# Altium footprint library zynq.PcbLib: 111 footprints (part 3 of 7)
Each footprint in its own frame and in the unit in brackets; x right, y up, seen from the top. Pads: shape width x height; smd on the part's side, far side on the other; paste and mask are expansions set on the pad; w line width, h text height; cw(c..) or ccw(c..) is an arc to the next point about the centre after c.
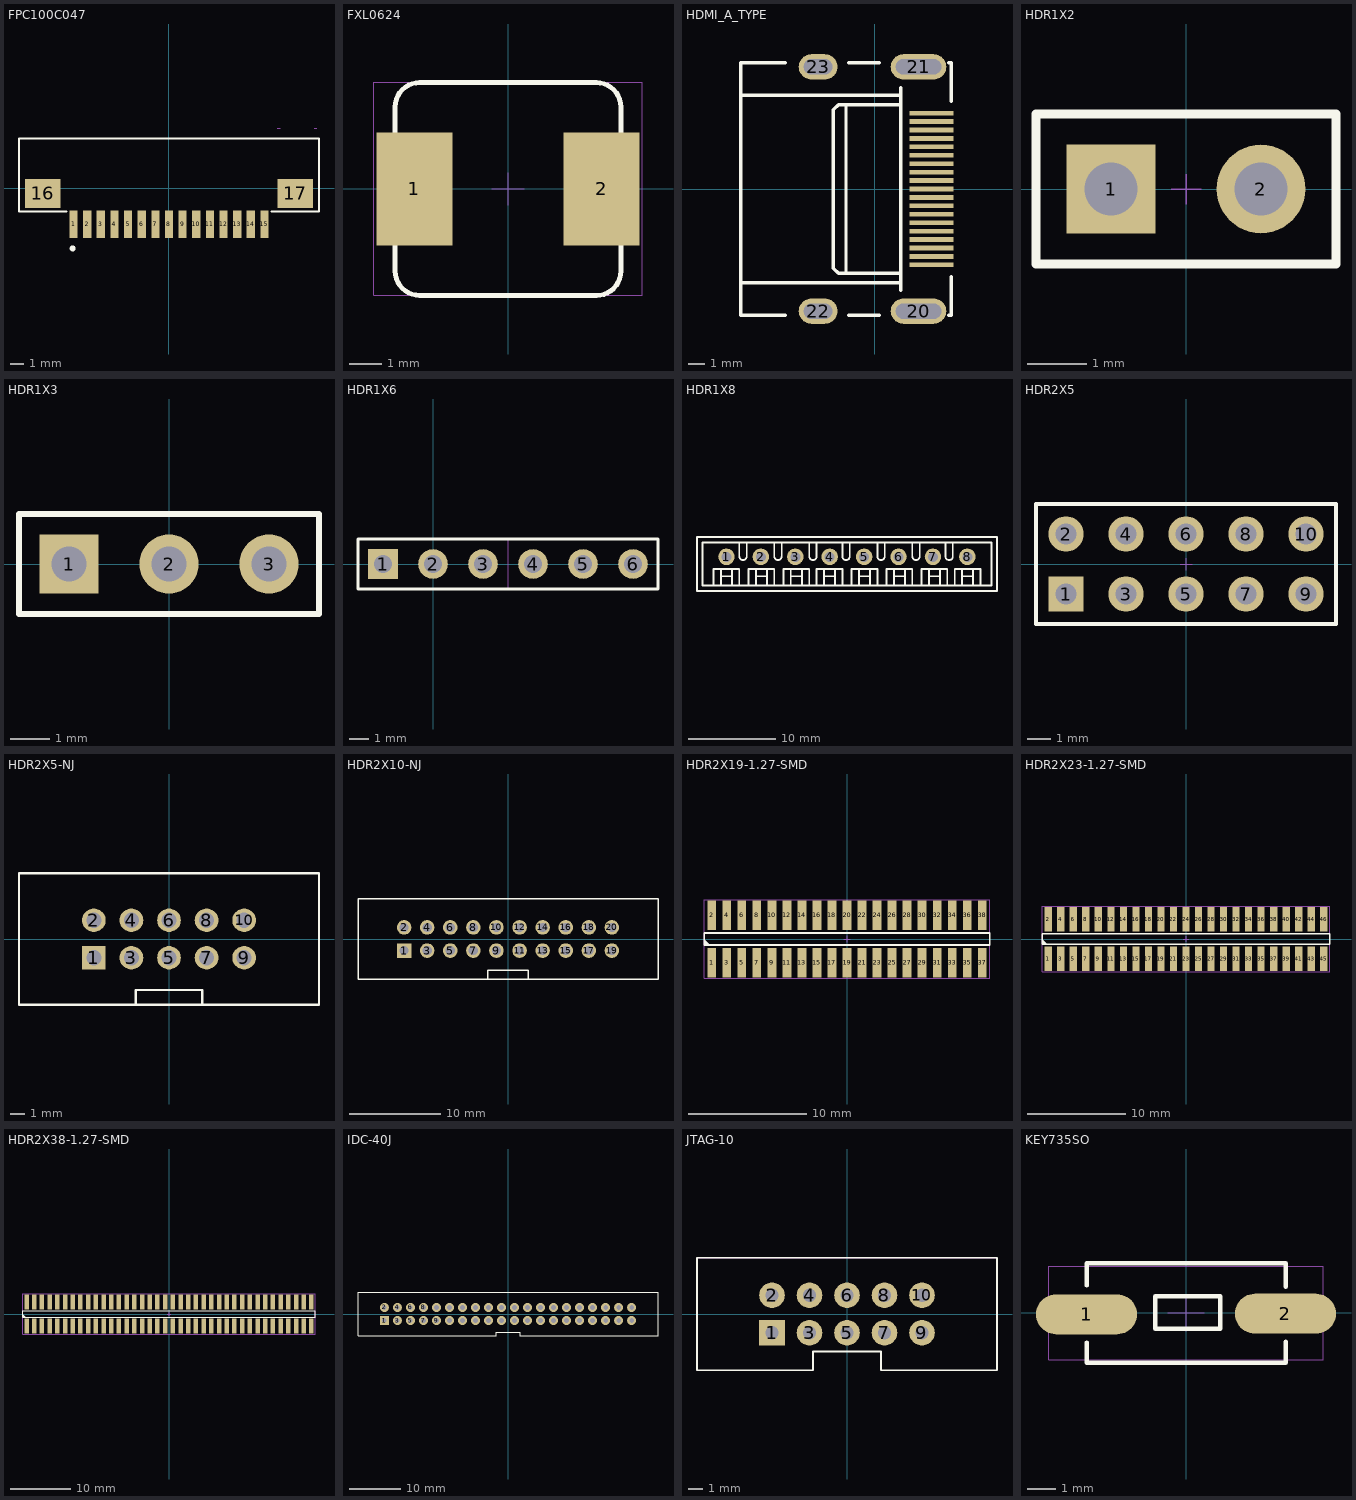
[diagram p2: the footprints below, top view; thin cyan lines are the x and y axes]

## FPC100C047 [mm] "FPC100C047"
pads (17):
  rect 0.6x2 smd: 1(-7,-2.64) 2(-6,-2.64) 3(-5,-2.64) 4(-4,-2.64) 5(-3,-2.64) 6(-2,-2.64) 7(-1,-2.64) 8(0,-2.64) 9(1,-2.64) 10(2,-2.64) 11(3,-2.64) 12(4,-2.64) 13(5,-2.64) 14(6,-2.64) 15(7,-2.64)
  rect 2.6x2.1 smd: 16(-9.25,-0.39) 17(9.25,-0.39)
Top Overlay:
  circle w0.254: c-7.061,-4.42 r0.092
  lines w0.152: -7.517,-1.71 -11,-1.71 -11,3.64 11,3.64 11,-1.71 7.517,-1.71
Mechanical 11:
  lines w0.025: 7.952,4.391 8.155,4.391 ; 10.644,4.391 10.847,4.391

## FXL0624 [mm]
pads (2):
  rect 2.35x3.5 smd: 1(-2.9,0) 2(2.9,0)
Top Overlay:
  lines w0.152: 2.738,-3.304 ccw(c2.738,-2.542) 3.5,-2.542 3.5,2.538 ccw(c2.738,2.538) 2.738,3.3 -2.738,3.3 ccw(c-2.738,2.538) -3.5,2.538 -3.5,-2.538 ccw(c-2.738,-2.538) -2.738,-3.3 2.742,-3.3
Mechanical 15:
  lines w0.025: -0.5,0 0.5,0 ; 0,-0.5 0,0.5 ; -4.166,-3.302 -4.166,3.302 4.166,3.302 4.166,-3.302 -4.166,-3.302
3D body "FXL0630.STEP": height 2.35, standoff 0, extent -3.74,-3.302 3.74,3.298

## HDMI_A_TYPE [mm] "HDMI_A_TYPE"
pads (23):
  rect 2.6x0.28 smd: 1(3.361,-4.5) 2(3.361,-4) 3(3.361,-3.5) 4(3.361,-3) 5(3.361,-2.5) 6(3.361,-2) 7(3.361,-1.5) 8(3.361,-1) 9(3.361,-0.5) 10(3.361,0) 11(3.361,0.5) 12(3.361,1) 13(3.361,1.5) 14(3.361,2) 15(3.361,2.5) 16(3.361,3) 17(3.361,3.5) 18(3.361,4) 19(3.361,4.5)
  oval 3.3x1.5 hole 2.7 slot 0.9 at 90 deg: 20(2.6,-7.25) 21(2.6,7.25)
  oval 2.3x1.5 hole 1.7 slot 0.9 at 90 deg: 22(-3.361,-7.25) 23(-3.361,7.25)
Top Overlay:
  lines w0.203: -7.951,-5.551 1.549,-5.551 ; -7.951,5.551 1.549,5.551 ; -5.297,-7.5 -7.951,-7.5 -7.951,7.5 -5.297,7.5 ; -1.706,-5 -1.706,5 ; -1.552,-7.5 0.266,-7.5 ; -1.552,7.5 0.266,7.5 ; 1.549,-6 1.549,6 ; 1.549,-5 -2.151,-5 -2.451,-4.7 -2.451,4.7 -2.151,5 1.549,5 ; 4.383,-7.5 4.549,-7.5 4.549,-5.214 ; 4.383,7.5 4.549,7.5 4.549,5.214

## HDR1X2 [mm] "Connector; Header; 5x2 Position"
pads (2):
  rect 1.5x1.5 hole 0.9: 1(-1.27,0)
  round 1.5 hole 0.9: 2(1.27,0)
Top Overlay:
  lines w0.152: -2.54,-1.27 -2.54,1.27 2.54,1.27 2.54,-1.27 -2.54,-1.27
Mechanical 15:
  lines w0.025: -0.254,0 0.254,0 ; 0,-0.254 0,0.254 ; -2.54,-1.27 -2.54,1.27 2.54,1.27 2.54,-1.27 -2.54,-1.27
3D body "header-2.54-1x2.STEP": height 9.3, standoff -2.2, extent -2.54,-1.25 2.54,1.25

## HDR1X3 [mm] "Connector; Header; 5x2 Position"
pads (3):
  rect 1.5x1.5 hole 0.9: 1(-2.54,0)
  round 1.5 hole 0.9: 2(0,0) 3(2.54,0)
Top Overlay:
  lines w0.152: -3.81,-1.27 -3.81,1.27 3.81,1.27 3.81,-1.27 -3.81,-1.27
Mechanical 15:
  lines w0.025: -0.254,0 0.254,0 ; 0,-0.254 0,0.254 ; -3.81,-1.27 3.81,-1.27 3.81,1.27 -3.81,1.27 -3.81,-1.27
3D body "header-2.54-1x3.STEP": height 9.3, standoff -2.2, extent -3.81,-1.25 3.81,1.25

## HDR1X6 [mm] "Connector; Header; 5x2 Position"
pads (6):
  rect 1.5x1.5 hole 0.9: 1(-2.54,0)
  round 1.5 hole 0.9: 2(0,0) 3(2.54,0) 4(5.08,0) 5(7.62,0) 6(10.16,0)
Top Overlay:
  lines w0.152: -3.81,-1.27 11.43,-1.27 11.43,1.27 -3.81,1.27 -3.81,-1.27
Mechanical 15:
  lines w0.025: -0.254,0 0.254,0 ; 0,-0.254 0,0.254 ; -3.81,-1.27 -3.81,1.27 3.81,1.27 3.81,-1.27 -3.81,-1.27

## HDR1X8 [mm]
pads (8):
  round 1.9 hole 1.15: 1(6.401,-44.145) 2(10.359,-44.145) 3(14.317,-44.145) 4(18.275,-44.145) 5(22.233,-44.145) 6(26.192,-44.145) 7(30.15,-44.145) 8(34.108,-44.145)
Top Overlay:
  lines w0.203: 3.649,-42.494 3.649,-47.447 36.881,-47.447 36.881,-42.494 3.683,-42.494 ; 4.919,-47.447 4.919,-45.542 7.882,-45.542 7.882,-47.447 ; 5.766,-47.447 5.766,-45.542 ; 5.766,-46.389 7.036,-46.389 ; 7.036,-47.447 7.036,-45.542 ; 7.882,-42.621 7.882,-44.103 ccw(c8.306,-44.103) 8.729,-44.103 8.729,-42.621 ; 8.941,-47.447 8.941,-45.542 11.904,-45.542 11.904,-47.447 ; 9.787,-47.447 9.787,-45.542 ; 9.787,-46.389 11.057,-46.389 ; 11.057,-47.447 11.057,-45.542 ; 11.904,-42.621 11.904,-44.103 ccw(c12.327,-44.103) 12.751,-44.103 12.751,-42.621 ; 12.962,-47.447 12.962,-45.542 15.926,-45.542 15.926,-47.447 ; 13.809,-47.447 13.809,-45.542 ; 13.809,-46.389 15.079,-46.389 ; 15.079,-47.447 15.079,-45.542 ; 15.926,-42.621 15.926,-44.103 ccw(c16.349,-44.103) 16.772,-44.103 16.772,-42.621 ; 16.772,-47.447 16.772,-45.542 19.736,-45.542 19.736,-47.447 ; 17.619,-47.447 17.619,-45.542 ; 17.619,-46.389 18.889,-46.389 ; 18.889,-47.447 18.889,-45.542 ; 19.736,-42.621 19.736,-44.103 ccw(c20.159,-44.103) 20.582,-44.103 20.582,-42.621 ; 20.794,-47.447 20.794,-45.542 23.757,-45.542 23.757,-47.447 ; 21.641,-47.447 21.641,-45.542 ; 21.641,-46.389 22.911,-46.389 ; 22.911,-47.447 22.911,-45.542 ; 23.757,-42.621 23.757,-44.103 ccw(c24.181,-44.103) 24.604,-44.103 24.604,-42.621 ; 24.816,-47.447 24.816,-45.542 27.779,-45.542 27.779,-47.447 ; 25.662,-47.447 25.662,-45.542 ; 25.662,-46.389 26.932,-46.389 ; 26.932,-47.447 26.932,-45.542 ; 27.779,-42.621 27.779,-44.103 ccw(c28.202,-44.103) 28.626,-44.103 28.626,-42.621 ; 28.837,-47.447 28.837,-45.542 31.801,-45.542 31.801,-47.447 ; 29.684,-47.447 29.684,-45.542 ; 29.684,-46.389 30.954,-46.389 ; 30.954,-47.447 30.954,-45.542 ; 31.589,-42.621 31.589,-44.103 ccw(c32.012,-44.103) 32.436,-44.103 32.436,-42.621 ; 32.647,-47.447 32.647,-45.542 35.611,-45.542 35.611,-47.447 ; 33.494,-47.447 33.494,-45.542 ; 33.494,-46.389 34.764,-46.389 ; 34.764,-47.447 34.764,-45.542 ; 3.014,-48.082 3.014,-41.859 37.516,-41.859 37.516,-48.082 3.014,-48.082

## HDR2X5 [mm] "Connector; Header; 5x2 Position"
pads (10):
  rect 1.5x1.5 hole 0.9: 1(-5.08,-1.27)
  round 1.5 hole 0.9: 2(-5.08,1.27) 3(-2.54,-1.27) 4(-2.54,1.27) 5(0,-1.27) 6(0,1.27) 7(2.54,-1.27) 8(2.54,1.27) 9(5.08,-1.27) 10(5.08,1.27)
Top Overlay:
  lines w0.152: -6.35,-2.54 6.35,-2.54 6.35,2.54 -6.35,2.54 -6.35,-2.54
Mechanical 15:
  lines w0.025: -0.254,0 0.254,0 ; 0,-0.254 0,0.254 ; -6.35,-2.54 6.35,-2.54 6.35,2.54 -6.35,2.54 -6.35,-2.54
3D body "header-2.54-2x5.STEP": height 9.3, standoff -2.2, extent -6.35,-2.54 6.35,2.54

## HDR2X5-NJ [mm]
pads (10):
  rect 1.6x1.6 hole 1.02: 1(-5.08,-1.27)
  round 1.6 hole 1.02: 2(-5.08,1.27) 3(-2.54,-1.27) 4(-2.54,1.27) 5(0,-1.27) 6(0,1.27) 7(2.54,-1.27) 8(2.54,1.27) 9(5.08,-1.27) 10(5.08,1.27)
Top Overlay:
  lines w0.152: -2.25,-4.45 -2.25,-3.45 2.25,-3.45 2.25,-4.45 ; -10.15,-4.45 -10.15,4.45 10.15,4.45 10.15,-4.45 -10.15,-4.45
3D body "jn-2.54-2x5.STEP": height 9, standoff -1.55, extent -10.15,-4.5 10.15,4.6

## HDR2X10-NJ [mm]
pads (20):
  rect 1.6x1.6 hole 1.02: 1(-11.43,-1.27)
  round 1.6 hole 1.02: 2(-11.43,1.27) 3(-8.89,-1.27) 4(-8.89,1.27) 5(-6.35,-1.27) 6(-6.35,1.27) 7(-3.81,-1.27) 8(-3.81,1.27) 9(-1.27,-1.27) 10(-1.27,1.27) 11(1.27,-1.27) 12(1.27,1.27) 13(3.81,-1.27) 14(3.81,1.27) 15(6.35,-1.27) 16(6.35,1.27) 17(8.89,-1.27) 18(8.89,1.27) 19(11.43,-1.27) 20(11.43,1.27)
Top Overlay:
  lines w0.152: -2.25,-4.45 -2.25,-3.45 2.25,-3.45 2.25,-4.45 ; -16.5,-4.45 -16.5,4.45 16.5,4.45 16.5,-4.45 -16.5,-4.45
3D body "jn-2.54-2x10.STEP": height 9, standoff -1.55, extent -16.5,-4.45 16.5,4.65

## HDR2X19-1.27-SMD [mm]
pads (38):
  rect 0.74x2.5 smd: 1(-11.43,-2) 2(-11.43,2) 3(-10.16,-2) 4(-10.16,2) 5(-8.89,-2) 6(-8.89,2) 7(-7.62,-2) 8(-7.62,2) 9(-6.35,-2) 10(-6.35,2) 11(-5.08,-2) 12(-5.08,2) 13(-3.81,-2) 14(-3.81,2) 15(-2.54,-2) 16(-2.54,2) 17(-1.27,-2) 18(-1.27,2) 19(0,-2) 20(0,2) 21(1.27,-2) 22(1.27,2) 23(2.54,-2) 24(2.54,2) 25(3.81,-2) 26(3.81,2) 27(5.08,-2) 28(5.08,2) 29(6.35,-2) 30(6.35,2) 31(7.62,-2) 32(7.62,2) 33(8.89,-2) 34(8.89,2) 35(10.16,-2) 36(10.16,2) 37(11.43,-2) 38(11.43,2)
Top Overlay:
  region: -12.065,0 -11.557,-0.508 -12.065,-0.508
  lines w0.152: -12.065,-0.508 -12.065,0.508 12.065,0.508 12.065,-0.508 -12.065,-0.508
Mechanical 15:
  lines w0.025: -0.254,0 0.254,0 ; 0,-0.254 0,0.254 ; -12.065,-3.302 12.065,-3.302 12.065,3.302 -12.065,3.302 -12.065,-3.302
3D body "header-1.27-2x19.STEP": height 3.71, standoff 0, extent -12.065,-2.415 12.065,2.415

## HDR2X23-1.27-SMD [mm]
pads (46):
  rect 0.74x2.5 smd: 1(-13.97,-2) 2(-13.97,2) 3(-12.7,-2) 4(-12.7,2) 5(-11.43,-2) 6(-11.43,2) 7(-10.16,-2) 8(-10.16,2) 9(-8.89,-2) 10(-8.89,2) 11(-7.62,-2) 12(-7.62,2) 13(-6.35,-2) 14(-6.35,2) 15(-5.08,-2) 16(-5.08,2) 17(-3.81,-2) 18(-3.81,2) 19(-2.54,-2) 20(-2.54,2) 21(-1.27,-2) 22(-1.27,2) 23(0,-2) 24(0,2) 25(1.27,-2) 26(1.27,2) 27(2.54,-2) 28(2.54,2) 29(3.81,-2) 30(3.81,2) 31(5.08,-2) 32(5.08,2) 33(6.35,-2) 34(6.35,2) 35(7.62,-2) 36(7.62,2) 37(8.89,-2) 38(8.89,2) 39(10.16,-2) 40(10.16,2) 41(11.43,-2) 42(11.43,2) 43(12.7,-2) 44(12.7,2) 45(13.97,-2) 46(13.97,2)
Top Overlay:
  region: -14.605,0 -14.097,-0.508 -14.605,-0.508
  lines w0.152: -14.605,-0.508 -14.605,0.508 14.605,0.508 14.605,-0.508 -14.605,-0.508
Mechanical 15:
  lines w0.025: -0.254,0 0.254,0 ; 0,-0.254 0,0.254 ; -14.605,-3.302 14.605,-3.302 14.605,3.302 -14.605,3.302 -14.605,-3.302
3D body "header-1.27-2x23.STEP": height 3.71, standoff 0, extent -14.605,-2.415 14.605,2.415

## HDR2X38-1.27-SMD [mm]
pads (76):
  rect 0.74x2.5 smd: 1(-23.495,-2) 2(-23.495,2) 3(-22.225,-2) 4(-22.225,2) 5(-20.955,-2) 6(-20.955,2) 7(-19.685,-2) 8(-19.685,2) 9(-18.415,-2) 10(-18.415,2) 11(-17.145,-2) 12(-17.145,2) 13(-15.875,-2) 14(-15.875,2) 15(-14.605,-2) 16(-14.605,2) 17(-13.335,-2) 18(-13.335,2) 19(-12.065,-2) 20(-12.065,2) 21(-10.795,-2) 22(-10.795,2) 23(-9.525,-2) 24(-9.525,2) 25(-8.255,-2) 26(-8.255,2) 27(-6.985,-2) 28(-6.985,2) 29(-5.715,-2) 30(-5.715,2) 31(-4.445,-2) 32(-4.445,2) 33(-3.175,-2) 34(-3.175,2) 35(-1.905,-2) 36(-1.905,2) 37(-0.635,-2) 38(-0.635,2) 39(0.635,-2) 40(0.635,2) 41(1.905,-2) 42(1.905,2) 43(3.175,-2) 44(3.175,2) 45(4.445,-2) 46(4.445,2) 47(5.715,-2) 48(5.715,2) 49(6.985,-2) 50(6.985,2) 51(8.255,-2) 52(8.255,2) 53(9.525,-2) 54(9.525,2) 55(10.795,-2) 56(10.795,2) 57(12.065,-2) 58(12.065,2) 59(13.335,-2) 60(13.335,2) 61(14.605,-2) 62(14.605,2) 63(15.875,-2) 64(15.875,2) 65(17.145,-2) 66(17.145,2) 67(18.415,-2) 68(18.415,2) 69(19.685,-2) 70(19.685,2) 71(20.955,-2) 72(20.955,2) 73(22.225,-2) 74(22.225,2) 75(23.495,-2) 76(23.495,2)
Top Overlay:
  region: -24.13,0 -23.622,-0.508 -24.13,-0.508
  lines w0.152: -24.13,-0.508 24.13,-0.508 24.13,0.508 -24.13,0.508 -24.13,-0.508
Mechanical 15:
  lines w0.025: -0.254,0 0.254,0 ; 0,-0.254 0,0.254 ; -24.13,-3.302 24.13,-3.302 24.13,3.302 -24.13,3.302 -24.13,-3.302
3D body "header-1.27-2x38.STEP": height 3.71, standoff 0, extent -24.13,-2.415 24.13,2.415

## IDC-40J [mil] "IDC-40J"
pads (40):
  rect 68x68 hole 35: 1(-950,-50)
  round 68 hole 35: 2(-950,50) 3(-850,-50) 4(-850,50) 5(-750,-50) 6(-750,50) 7(-650,-50) 8(-650,50) 9(-550,-50) 10(-550,50) 11(-450,-50) 12(-450,50) 13(-350,-50) 14(-350,50) 15(-250,-50) 16(-250,50) 17(-150,-50) 18(-150,50) 19(-50,-50) 20(-50,50) 21(50,-50) 22(50,50) 23(150,-50) 24(150,50) 25(250,-50) 26(250,50) 27(350,-50) 28(350,50) 29(450,-50) 30(450,50) 31(550,-50) 32(550,50) 33(650,-50) 34(650,50) 35(750,-50) 36(750,50) 37(850,-50) 38(850,50) 39(950,-50) 40(950,50)
Top Overlay:
  lines w5: -1153.54,-166.54 -1153.54,166.54 1153.54,166.54 1153.54,-166.54 90.55,-166.54 90.02,-140 -91,-140 -91.54,-166.54 -1153.54,-166.54

## JTAG-10 [mm] "JTAG-10"
pads (10):
  rect 1.73x1.73 hole 0.89: 1(-5.08,-1.27)
  round 1.73 hole 0.89: 2(-5.08,1.27) 3(-2.54,-1.27) 4(-2.54,1.27) 5(0,-1.27) 6(0,1.27) 7(2.54,-1.27) 8(2.54,1.27) 9(5.08,-1.27) 10(5.08,1.27)
Top Overlay:
  lines w0.13: -9.14,3.81 -10.16,3.81 ; -10.16,-3.81 -9.65,-3.81 -2.29,-3.81 ; -10.16,-3.81 -10.16,3.81 ; -10.16,-3.81 -2.29,-3.81 ; -10.16,-3.81 -10.16,3.81 ; -10.16,3.81 10.16,3.81 10.16,-3.81 9.4,-3.81 2.29,-3.81 2.29,-2.79 2.29,-2.54 -2.29,-2.54 -2.29,-3.81
Mechanical 12:
  lines w0.025: -10.16,-3.81 -10.16,3.81 10.16,3.81 10.16,-3.81
Mechanical 13:
  lines w0.025: -10.16,-3.81 -10.16,3.81 10.16,3.81 10.16,-3.81

## KEY735SO [mil] "KEY735SO"
pads (2):
  oval 140x55.12 smd: 1(-137.5,-1.9) 2(137.5,-0.9)
Top Overlay:
  lines w6: -137.5,-40.9 -137.5,-68.9 138.09,-68.9 138.09,-39.9 ; -137.5,38.1 -137.5,68.9 138.09,68.9 138.09,36.1 ; -42.5,-21.9 47.5,-21.9 47.5,23.1 -42.5,23.1 -42.5,-21.9
Mechanical 15:
  lines w1: -25,0 25,0 ; 0,-25 0,25 ; -190,-65 190,-65 190,65 -190,65 -190,-65
3D body "k2-1101st-a4sa-01.STEP": height 197, standoff -39.22, extent -189.97,-65 189.97,64.92